# Altium footprint library 电阻封装库.PcbLib: 218 footprints (part 12 of 14)
Each footprint in its own frame and in the unit in brackets; x right, y up, seen from the top. Pads: shape width x height; smd on the part's side, far side on the other; paste and mask are expansions set on the pad; w line width, h text height; cw(c..) or ccw(c..) is an arc to the next point about the centre after c.
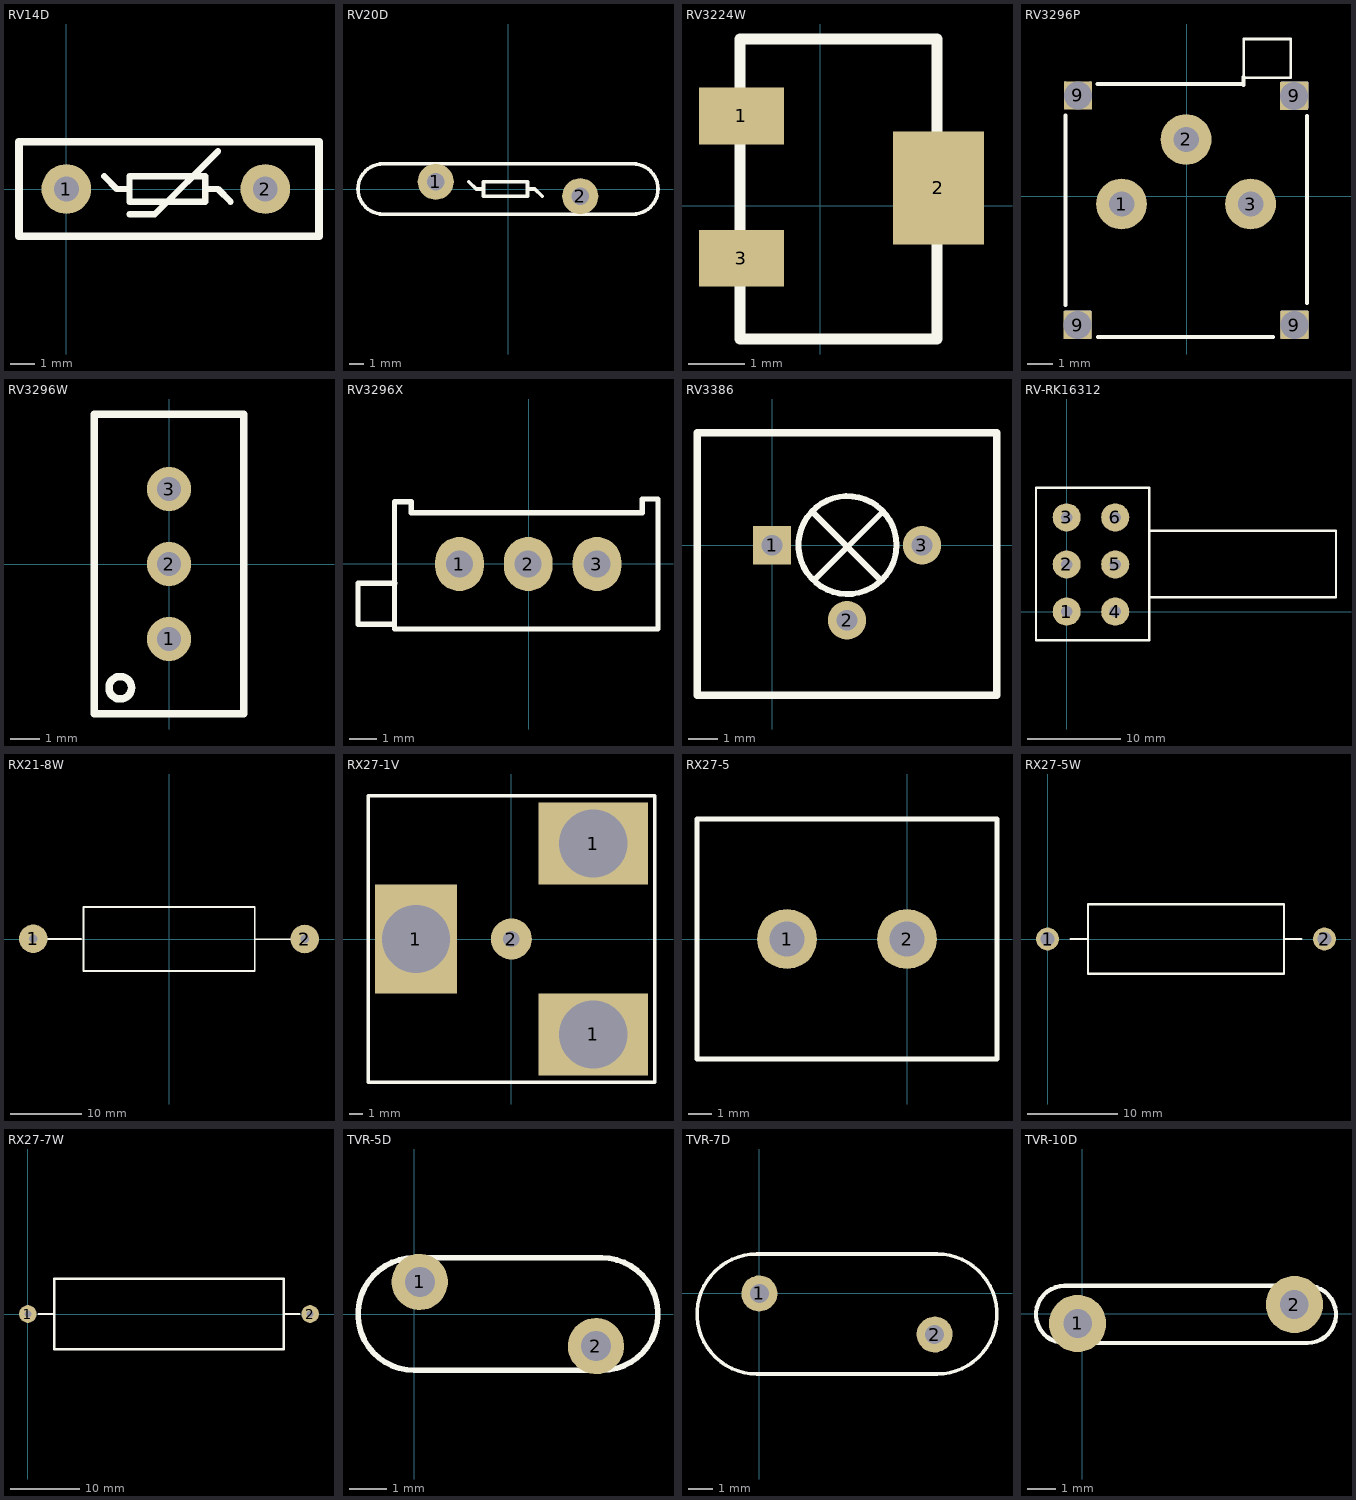
[diagram p11: the footprints below, top view; thin cyan lines are the x and y axes]

## RV14D [mm]
pads (2):
  round 2 hole 1: 1(0,0) 2(8,0)
Top Overlay:
  lines w0.254: 1.524,0.508 2.032,0 2.54,0 ; 2.54,-1.016 3.556,-1.016 6.096,1.524 ; 5.588,0 6.096,0 6.604,-0.508 ; 2.54,-0.508 5.588,-0.508 5.588,0.508 2.54,0.508 2.54,-0.508
  lines w0.305: 10.16,-1.905 -1.905,-1.905 -1.905,1.905 10.16,1.905 ; 10.16,-1.8 10.16,1.8
3D body "User Library-MOV 14mm.STEP": height 20.5, standoff -2, extent -4.686,-2.997 12.306,3.302

## RV20D [mm]
pads (2):
  round 2.5 hole 1.2: 1(-5,0.5) 2(5,-0.5)
Top Overlay:
  lines w0.254: -8.7,-1.75 8.7,-1.75 ; -8.7,1.75 8.7,1.75 ; -8.636,-1.75 cw(c-8.636,0) -8.636,1.75 ; -2.714,0.508 -2.206,0 -1.698,0 ; 1.35,0 1.858,0 2.366,-0.508 ; 8.636,-1.75 ccw(c8.636,0) 8.636,1.75 ; -1.698,-0.508 1.35,-0.508 1.35,0.508 -1.698,0.508 -1.698,-0.508
3D body "SW3dPS-MOV, 130V, 20MM, 15KA, STRAIGHT LEAD, WPI VZ20E201KBSX-VBN.STEP": height 24.75, standoff -4, extent -9.779,-1.722 10.221,1.778

## RV3224W [mm]
pads (3):
  rect 1.5x1 smd: 1(-1.397,1.583) 3(-1.397,-0.932)
  rect 1.6x2 smd: 2(2.083,0.313)
Top Overlay:
  lines w0.2: -1.422,-2.354 2.057,-2.354 2.057,2.942 -1.422,2.942 -1.422,-2.354
Mechanical 2:
  text "+" at -0.203,0.63 h0.76
3D body "3224W.stp": height 5.29, standoff 0, extent -1.627,-2.134 2.311,2.692

## RV3296P [mm]
pads (7):
  round 2 hole 1: 1(-2.558,-0.302) 2(-0.018,2.238) 3(2.522,-0.302)
  rect 1.1x1.1 hole 1.1 square: 9(-4.285,-5.066) 9(-4.28,3.97) 9(4.237,3.952) 9(4.243,-5.066)
Top Overlay:
  lines w0.1: -4.783,4.461 -4.783,3.481 -3.783,3.481 -3.783,4.461 ; 2.254,4.673 3.254,4.673 ; -4.783,-5.569 -4.783,-4.549 -3.783,-4.549 -3.783,-5.569 -4.783,-5.569 ; 2.246,4.673 2.246,6.193 4.111,6.193 4.111,4.673 2.246,4.673 ; 3.747,-5.569 3.747,-4.549 4.747,-4.549 4.747,-5.569 3.747,-5.569 ; 3.747,3.481 3.747,4.461 4.747,4.461 4.747,3.481 3.747,3.481
  lines w0.152: -4.765,-4.285 -4.765,3.184 ; -3.504,4.424 2.233,4.424 ; -3.481,-5.538 3.416,-5.538 ; 2.24,4.39 2.24,4.699 ; 4.745,-4.208 4.745,3.168
Mechanical 11:
  circle w0.1: c-0.018,2.201 r0.25
  circle w0.1: c2.522,-0.339 r0.25
  circle w0.1: c-2.558,-0.339 r0.25
3D body "User Library-3296P-K.STEP": height 5.4, standoff -1.5, extent -4.782,-5.569 4.747,5.981

## RV3296W [mm]
height 2.38
pads (3):
  round 1.5 hole 0.8: 1(0,-2.54) 2(0,0) 3(0,2.54)
Top Overlay:
  circle w0.254: c-1.651,-4.191 r0.381
  lines w0.254: -2.54,-5.08 -2.54,5.08 2.54,5.08 2.54,-5.08 -2.54,-5.08
3D body "3296 pot.step": height 11.55, standoff -6.4, extent -2.413,-4.765 2.418,4.765

## RV3296X [mm]
pads (3):
  oval 1.8x2 hole 1: 1(-2.561,-0.001) 2(-0.021,-0.001) 3(2.519,-0.001)
Top Overlay:
  lines w0.2: -5.031,-2.234 -6.309,-2.234 -6.309,-0.717 -4.959,-0.717 ; -4.962,-2.401 -4.962,2.299 -4.339,2.299 -4.339,1.899 -2.861,1.899 -2.261,1.899 -0.321,1.899 0.279,1.899 2.219,1.899 2.819,1.899 4.187,1.899 4.187,2.399 4.775,2.399 4.775,-2.401 3.779,-2.401 -3.821,-2.401 -4.962,-2.401
Mechanical 11:
  circle w0.1: c-2.561,0.009 r0.25
  circle w0.1: c-0.021,0.009 r0.25
  circle w0.1: c2.519,0.009 r0.25
3D body "User Library-Bourns - Trimpot 3296X.STEP": height 10.03, standoff -2.22, extent -6.301,-2.425 4.749,2.405

## RV3386 [mm]
pads (3):
  rect 1.3x1.3 hole 0.7: 1(0,0)
  round 1.3 hole 0.7: 2(2.54,-2.54) 3(5.08,0)
Top Overlay:
  circle w0.2: c2.558,0.006 r1.659
  lines w0.2: 1.348,1.149 3.687,-1.19 ; 1.441,-1.17 3.727,1.109
  lines w0.254: -2.54,-5.08 -2.54,3.81 7.62,3.81 7.62,-5.08 -2.54,-5.08

## RV-RK16312 [mm]
pads (6):
  round 3 hole 1.2: 1(0,0) 2(0,5.029) 3(0,10.058) 4(5.182,0) 5(5.182,5.029) 6(5.182,10.058)
Top Overlay:
  lines w0.254: 8.814,8.611 28.753,8.611 28.753,1.524 8.839,1.524 ; -3.277,-3.048 -3.277,13.208 8.814,13.208 8.814,-3.048 -3.277,-3.048

## RX21-8W [mm]
pads (2):
  round 4 hole 1.2: 1(-19,0.045) 2(19,0)
Top Overlay:
  lines w0.254: -18.109,0.009 -12.326,0.009 ; -12,-4.5 12,-4.5 12,4.5 -12,4.5 ; -11.962,-4.462 -11.962,4.5 ; 12.018,-0.027 18.209,-0.027

## RX27-1V [mm]
pads (4):
  rect 6x8 hole 5: 1(-7,0)
  rect 8x6 hole 5: 1(6,-7) 1(6,7)
  round 3 hole 1.2: 2(0,0)
Top Overlay:
  lines w0.254: -10.5,-10.5 10.5,-10.5 10.5,10.5 -10.5,10.5 -10.5,-10.5

## RX27-5 [mm]
pads (2):
  round 2.54 hole 1.5: 1(-5.08,0) 2(0,0)
Top Overlay:
  lines w0.203: -8.89,-5.08 3.81,-5.08 3.81,5.08 -8.89,5.08 -8.89,-5.08

## RX27-5W [mil]
pads (2):
  round 100 hole 60: 1(0,0) 2(1200,0)
Top Overlay:
  lines w10: 100,0 175,0 ; 1025,0 1100,0 ; 175,0 175,150 1025,150 1025,-150 175,-150 175,0

## RX27-7W [mil]
pads (2):
  round 100 hole 40: 1(0,0) 2(1600,0)
Top Overlay:
  lines w12: 60,0 150,0 ; 1450,0 1540,0 ; 150,-200 1450,-200 1450,200 150,200 150,-200

## TVR-5D [mm]
pads (2):
  round 1.5 hole 0.8: 1(0.147,0.858) 2(4.845,-0.852)
Top Overlay:
  lines w0.15: 0,-1.5 cw(c0,0) 0,1.5 5,1.5 cw(c5,0) 5,-1.5 0,-1.5
3D body "User Library-B57237.STEP": height 24.5, standoff -1.95, extent -4.025,-3.573 10.975,3.427

## TVR-7D [mm]
pads (2):
  round 1.5 hole 0.8: 1(0,0) 2(7.302,-1.71)
Top Overlay:
  lines w0.15: -0.099,-3.355 cw(c-0.099,-0.855) -0.099,1.645 7.401,1.645 cw(c7.401,-0.855) 7.401,-3.355 -0.099,-3.355
3D body "电?": height 2.85, standoff -20.25, extent -2.599,-3.355 9.901,1.645

## TVR-10D [mm]
pads (2):
  round 2 hole 1: 1(-0.159,-0.334) 2(7.432,0.33)
Top Overlay:
  lines w0.15: -0.613,-1.016 cw(c-0.613,-0.016) -0.613,0.984 7.887,0.984 cw(c7.887,-0.016) 7.887,-1.016 -0.613,-1.016
3D body "User Library-final MOV7,5.step": height 16.5, standoff -2, extent -1.865,-0.927 9.418,0.923